# Altium footprint library My Library.PcbLib: 872 footprints (part 45 of 55)
Each footprint in its own frame and in the unit in brackets; x right, y up, seen from the top. Pads: shape width x height; smd on the part's side, far side on the other; paste and mask are expansions set on the pad; w line width, h text height; cw(c..) or ccw(c..) is an arc to the next point about the centre after c.
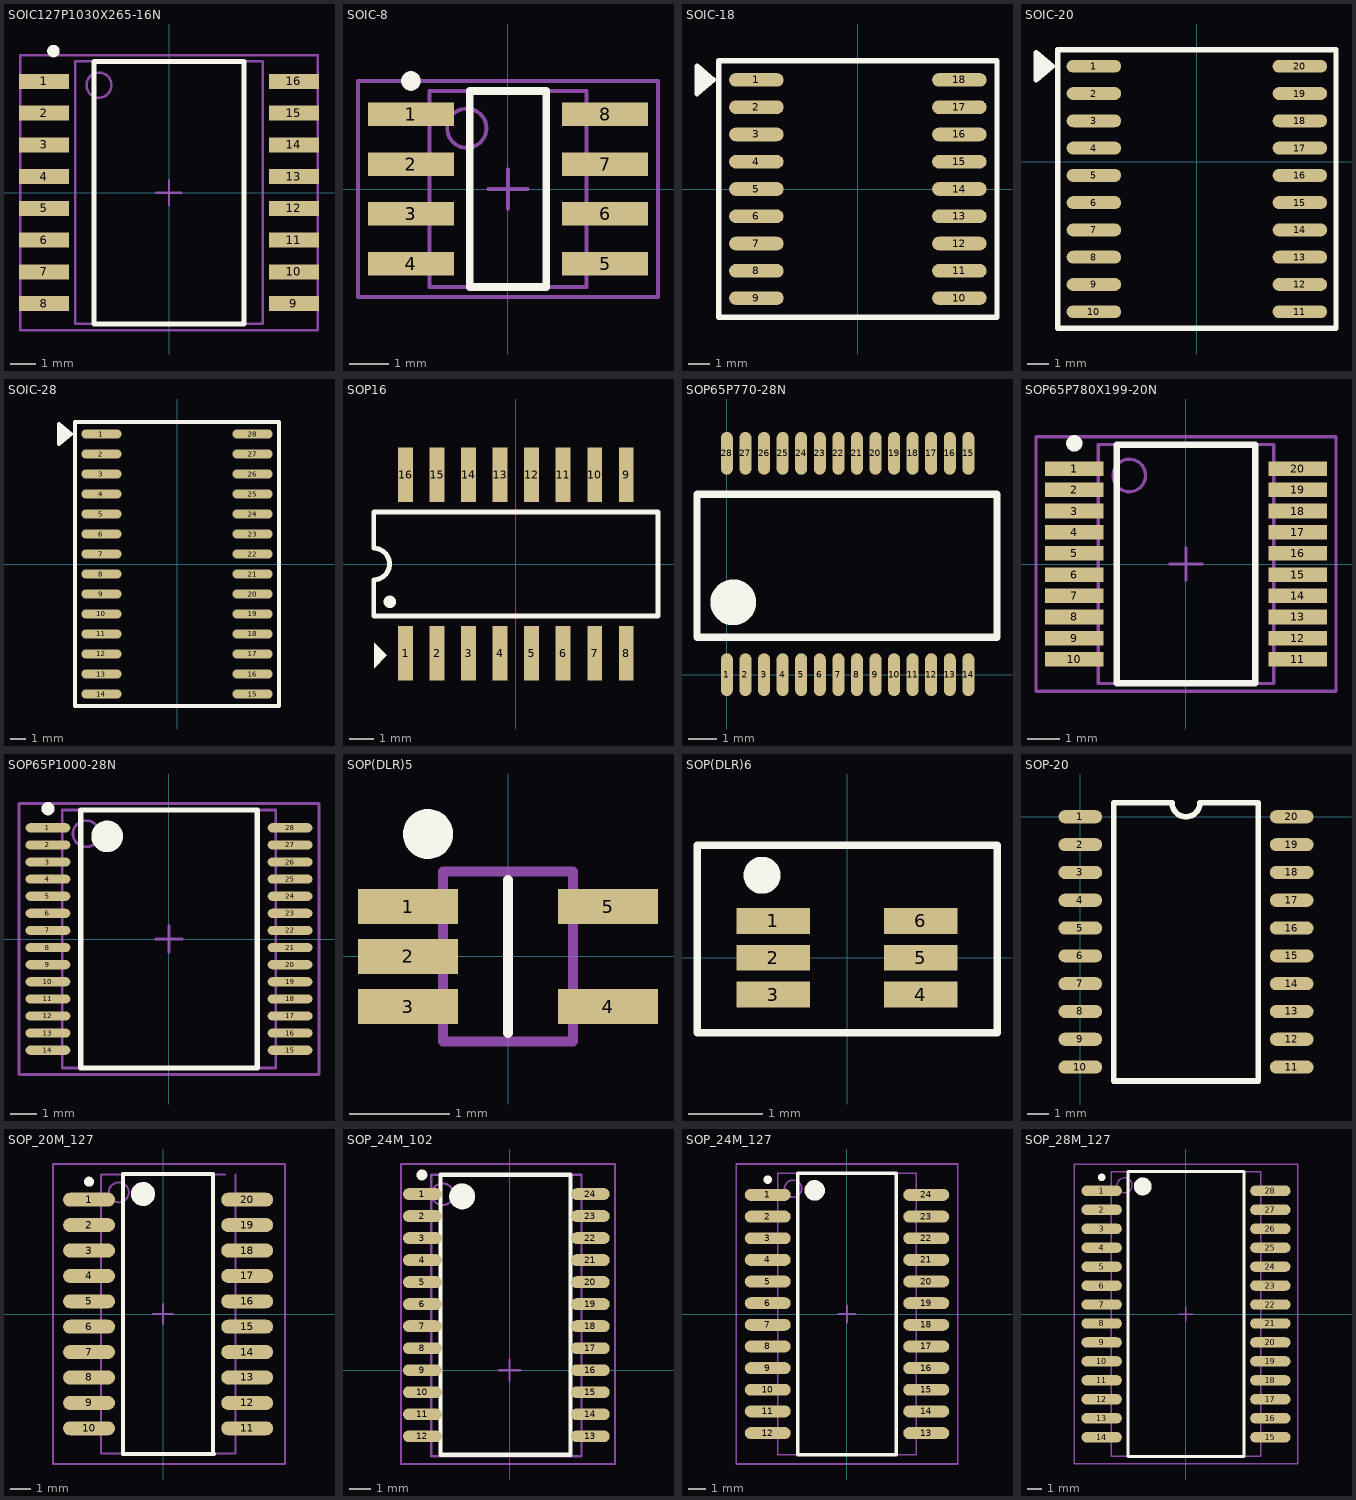
[diagram p44: the footprints below, top view; thin cyan lines are the x and y axes]

## SOIC127P1030X265-16N [mm] "SOIC, 16-Leads, Body 10,5x7,5mm (max), Pitch 1,27mm, IPC Medium Density"
height 2.65
pads (16):
  rect 2x0.6 smd: 1(-5,4.445) 2(-5,3.175) 3(-5,1.905) 4(-5,0.635) 5(-5,-0.635) 6(-5,-1.905) 7(-5,-3.175) 8(-5,-4.445) 9(5,-4.445) 10(5,-3.175) 11(5,-1.905) 12(5,-0.635) 13(5,0.635) 14(5,1.905) 15(5,3.175) 16(5,4.445)
Top Overlay:
  circle w0.25: c-4.621,5.664 r0.125
  lines w0.2: -3,-5.25 3,-5.25 3,5.25 -3,5.25 -3,-5.25
Mechanical 13:
  circle w0.1: c-2.8,4.3 r0.5
  lines w0.1: -3.75,-5.25 3.75,-5.25 3.75,5.25 -3.75,5.25 -3.75,-5.25
Mechanical 15:
  lines w0.1: -0.5,0 0.5,0 ; 0,-0.5 0,0.5 ; -5.95,-5.5 5.95,-5.5 5.95,5.5 -5.95,5.5 -5.95,-5.5
3D body: height 2.65, standoff 0.1, extent -3.75,-5.25 3.75,5.25
3D body: height 1.35, standoff 1.25, extent -4.492,4.191 -3.222,4.699
3D body: height 1.35, standoff 0, extent -4.619,4.191 -4.492,4.699
3D body: height 0.1, standoff 0, extent -5.381,4.191 -4.619,4.699
3D body: height 1.35, standoff 1.25, extent -4.492,2.921 -3.222,3.429
3D body: height 1.35, standoff 0, extent -4.619,2.921 -4.492,3.429
3D body: height 0.1, standoff 0, extent -5.381,2.921 -4.619,3.429
3D body: height 1.35, standoff 1.25, extent -4.492,1.651 -3.222,2.159
3D body: height 1.35, standoff 0, extent -4.619,1.651 -4.492,2.159
3D body: height 0.1, standoff 0, extent -5.381,1.651 -4.619,2.159
3D body: height 1.35, standoff 1.25, extent -4.492,0.381 -3.222,0.889
3D body: height 1.35, standoff 0, extent -4.619,0.381 -4.492,0.889
3D body: height 0.1, standoff 0, extent -5.381,0.381 -4.619,0.889
3D body: height 1.35, standoff 1.25, extent -4.492,-0.889 -3.222,-0.381
3D body: height 1.35, standoff 0, extent -4.619,-0.889 -4.492,-0.381
3D body: height 0.1, standoff 0, extent -5.381,-0.889 -4.619,-0.381
3D body: height 1.35, standoff 1.25, extent -4.492,-2.159 -3.222,-1.651
3D body: height 1.35, standoff 0, extent -4.619,-2.159 -4.492,-1.651
3D body: height 0.1, standoff 0, extent -5.381,-2.159 -4.619,-1.651
3D body: height 1.35, standoff 1.25, extent -4.492,-3.429 -3.222,-2.921
3D body: height 1.35, standoff 0, extent -4.619,-3.429 -4.492,-2.921
3D body: height 0.1, standoff 0, extent -5.381,-3.429 -4.619,-2.921
3D body: height 1.35, standoff 1.25, extent -4.492,-4.699 -3.222,-4.191
3D body: height 1.35, standoff 0, extent -4.619,-4.699 -4.492,-4.191
3D body: height 0.1, standoff 0, extent -5.381,-4.699 -4.619,-4.191
3D body: height 1.35, standoff 1.25, extent 3.222,4.191 4.492,4.699
3D body: height 1.35, standoff 0, extent 4.492,4.191 4.619,4.699
3D body: height 0.1, standoff 0, extent 4.619,4.191 5.381,4.699
3D body: height 1.35, standoff 1.25, extent 3.222,2.921 4.492,3.429
3D body: height 1.35, standoff 0, extent 4.492,2.921 4.619,3.429
3D body: height 0.1, standoff 0, extent 4.619,2.921 5.381,3.429
3D body: height 1.35, standoff 1.25, extent 3.222,1.651 4.492,2.159
3D body: height 1.35, standoff 0, extent 4.492,1.651 4.619,2.159
3D body: height 0.1, standoff 0, extent 4.619,1.651 5.381,2.159
3D body: height 1.35, standoff 1.25, extent 3.222,0.381 4.492,0.889
3D body: height 1.35, standoff 0, extent 4.492,0.381 4.619,0.889
3D body: height 0.1, standoff 0, extent 4.619,0.381 5.381,0.889
3D body: height 1.35, standoff 1.25, extent 3.222,-0.889 4.492,-0.381
3D body: height 1.35, standoff 0, extent 4.492,-0.889 4.619,-0.381
3D body: height 0.1, standoff 0, extent 4.619,-0.889 5.381,-0.381
3D body: height 1.35, standoff 1.25, extent 3.222,-2.159 4.492,-1.651
3D body: height 1.35, standoff 0, extent 4.492,-2.159 4.619,-1.651
3D body: height 0.1, standoff 0, extent 4.619,-2.159 5.381,-1.651
3D body: height 1.35, standoff 1.25, extent 3.222,-3.429 4.492,-2.921
3D body: height 1.35, standoff 0, extent 4.492,-3.429 4.619,-2.921
3D body: height 0.1, standoff 0, extent 4.619,-3.429 5.381,-2.921
3D body: height 0.1, standoff 0, extent 4.619,-4.699 5.381,-4.191
3D body: height 1.35, standoff 0, extent 4.492,-4.699 4.619,-4.191
3D body: height 1.35, standoff 1.25, extent 3.222,-4.699 4.492,-4.191

## SOIC-8 [mm] "SOIC, 8-Leads, Body 5,0x4,0mm (max), Pitch 1,27mm, IPC Medium Density"
height 1.75
pads (8):
  rect 2.2x0.6 smd: 1(-2.475,1.905) 2(-2.475,0.635) 3(-2.475,-0.635) 4(-2.475,-1.905) 5(2.475,-1.905) 6(2.475,-0.635) 7(2.475,0.635) 8(2.475,1.905)
Top Overlay:
  circle w0.25: c-2.475,2.755 r0.125
  lines w0.2: -0.975,-2.5 -0.975,2.5 0.975,2.5 0.975,-2.5 -0.975,-2.5
Mechanical 13:
  circle w0.1: c-1.05,1.55 r0.5
  lines w0.1: -2,-2.5 -2,2.5 2,2.5 2,-2.5 -2,-2.5
Mechanical 15:
  lines w0.1: -0.5,0 0.5,0 ; 0,-0.5 0,0.5 ; -3.825,-2.75 -3.825,2.75 3.825,2.75 3.825,-2.75 -3.825,-2.75
3D body: height 1.75, standoff 0.25, extent -2,-2.5 2,2.5
3D body: height 0.25, standoff 0, extent 2.515,-2.159 3.2,-1.651
3D body: height 0.9, standoff 0.65, extent 2,-2.159 2.515,-1.651
3D body: height 0.9, standoff 0, extent 2.413,-2.159 2.565,-1.651
3D body: height 0.9, standoff 0, extent 2.413,-0.889 2.565,-0.381
3D body: height 0.9, standoff 0.65, extent 2,-0.889 2.515,-0.381
3D body: height 0.25, standoff 0, extent 2.515,-0.889 3.2,-0.381
3D body: height 0.25, standoff 0, extent 2.515,1.651 3.2,2.159
3D body: height 0.9, standoff 0.65, extent 2,1.651 2.515,2.159
3D body: height 0.9, standoff 0, extent 2.413,1.651 2.565,2.159
3D body: height 0.9, standoff 0, extent 2.413,0.381 2.565,0.889
3D body: height 0.9, standoff 0.65, extent 2,0.381 2.515,0.889
3D body: height 0.25, standoff 0, extent 2.515,0.381 3.2,0.889
3D body: height 0.25, standoff 0, extent -3.2,-0.889 -2.515,-0.381
3D body: height 0.9, standoff 0.65, extent -2.515,-0.889 -2,-0.381
3D body: height 0.9, standoff 0, extent -2.565,-0.889 -2.413,-0.381
3D body: height 0.9, standoff 0, extent -2.565,-2.159 -2.413,-1.651
3D body: height 0.9, standoff 0.65, extent -2.515,-2.159 -2,-1.651
3D body: height 0.25, standoff 0, extent -3.2,-2.159 -2.515,-1.651
3D body: height 0.25, standoff 0, extent -3.2,0.381 -2.515,0.889
3D body: height 0.9, standoff 0.65, extent -2.515,0.381 -2,0.889
3D body: height 0.9, standoff 0, extent -2.565,0.381 -2.413,0.889
3D body: height 0.9, standoff 0, extent -2.565,1.651 -2.413,2.159
3D body: height 0.9, standoff 0.65, extent -2.515,1.651 -2,2.159
3D body: height 0.25, standoff 0, extent -3.2,1.651 -2.515,2.159

## SOIC-18 [mm]
pads (18):
  oval 2.54x0.635 smd: 1(-4.725,5.08) 2(-4.725,3.81) 3(-4.725,2.54) 4(-4.725,1.27) 5(-4.725,0) 6(-4.725,-1.27) 7(-4.725,-2.54) 8(-4.725,-3.81) 9(-4.725,-5.08) 10(4.725,-5.08) 11(4.725,-3.81) 12(4.725,-2.54) 13(4.725,-1.27) 14(4.725,0) 15(4.725,1.27) 16(4.725,2.54) 17(4.725,3.81) 18(4.725,5.08)
Top Overlay:
  region: -6.731,5.08 -7.493,5.715 -7.493,4.445
  lines w0.254: -7.493,4.445 -6.731,5.08 -7.493,5.715 -7.493,4.445 ; -6.477,-5.969 6.477,-5.969 6.477,5.969 -6.477,5.969 -6.477,-5.969
3D body: height 2.66, standoff 0, extent -3.359,4.541 -2.341,5.559
3D body: height 2.65, standoff 0.25, extent -3.8,-6 3.8,6
3D body: height 1.35, standoff 1.25, extent 3.531,4.826 4.013,5.334
3D body: height 1.35, standoff 0, extent 4.013,4.826 4.14,5.334
3D body: height 0.1, standoff 0, extent 4.14,4.826 5.029,5.334
3D body: height 1.35, standoff 1.25, extent 3.531,2.286 4.013,2.794
3D body: height 1.35, standoff 0, extent 4.013,2.286 4.14,2.794
3D body: height 0.1, standoff 0, extent 4.14,2.286 5.029,2.794
3D body: height 0.1, standoff 0, extent 4.14,3.556 5.029,4.064
3D body: height 1.35, standoff 0, extent 4.013,3.556 4.14,4.064
3D body: height 1.35, standoff 1.25, extent 3.531,3.556 4.013,4.064
3D body: height 1.35, standoff 1.25, extent 3.531,-0.254 4.013,0.254
3D body: height 1.35, standoff 0, extent 4.013,-0.254 4.14,0.254
3D body: height 0.1, standoff 0, extent 4.14,-0.254 5.029,0.254
3D body: height 0.1, standoff 0, extent 4.14,1.016 5.029,1.524
3D body: height 1.35, standoff 0, extent 4.013,1.016 4.14,1.524
3D body: height 1.35, standoff 1.25, extent 3.531,1.016 4.013,1.524
3D body: height 1.35, standoff 1.25, extent 3.531,-2.794 4.013,-2.286
3D body: height 1.35, standoff 0, extent 4.013,-2.794 4.14,-2.286
3D body: height 0.1, standoff 0, extent 4.14,-2.794 5.029,-2.286
3D body: height 0.1, standoff 0, extent 4.14,-1.524 5.029,-1.016
3D body: height 1.35, standoff 0, extent 4.013,-1.524 4.14,-1.016
3D body: height 1.35, standoff 1.25, extent 3.531,-1.524 4.013,-1.016
3D body: height 1.35, standoff 1.25, extent 3.531,-4.064 4.013,-3.556
3D body: height 1.35, standoff 0, extent 4.013,-4.064 4.14,-3.556
3D body: height 0.1, standoff 0, extent 4.14,-4.064 5.029,-3.556
3D body: height 0.1, standoff 0, extent 4.14,-5.334 5.029,-4.826
3D body: height 1.35, standoff 0, extent 4.013,-5.334 4.14,-4.826
3D body: height 1.35, standoff 1.25, extent 3.531,-5.334 4.013,-4.826
3D body: height 1.35, standoff 1.25, extent -4.013,-5.334 -3.531,-4.826
3D body: height 1.35, standoff 0, extent -4.14,-5.334 -4.013,-4.826
3D body: height 0.1, standoff 0, extent -5.029,-5.334 -4.14,-4.826
3D body: height 1.35, standoff 1.25, extent -4.013,-2.794 -3.531,-2.286
3D body: height 1.35, standoff 0, extent -4.14,-2.794 -4.013,-2.286
3D body: height 0.1, standoff 0, extent -5.029,-2.794 -4.14,-2.286
3D body: height 0.1, standoff 0, extent -5.029,-4.064 -4.14,-3.556
3D body: height 1.35, standoff 0, extent -4.14,-4.064 -4.013,-3.556
3D body: height 1.35, standoff 1.25, extent -4.013,-4.064 -3.531,-3.556
3D body: height 1.35, standoff 1.25, extent -4.013,-0.254 -3.531,0.254
3D body: height 1.35, standoff 0, extent -4.14,-0.254 -4.013,0.254
3D body: height 0.1, standoff 0, extent -5.029,-0.254 -4.14,0.254
3D body: height 0.1, standoff 0, extent -5.029,-1.524 -4.14,-1.016
3D body: height 1.35, standoff 0, extent -4.14,-1.524 -4.013,-1.016
3D body: height 1.35, standoff 1.25, extent -4.013,-1.524 -3.531,-1.016
3D body: height 1.35, standoff 1.25, extent -4.013,2.286 -3.531,2.794
3D body: height 1.35, standoff 0, extent -4.14,2.286 -4.013,2.794
3D body: height 0.1, standoff 0, extent -5.029,2.286 -4.14,2.794
3D body: height 0.1, standoff 0, extent -5.029,1.016 -4.14,1.524
3D body: height 1.35, standoff 0, extent -4.14,1.016 -4.013,1.524
3D body: height 1.35, standoff 1.25, extent -4.013,1.016 -3.531,1.524
3D body: height 1.35, standoff 1.25, extent -4.013,3.556 -3.531,4.064
3D body: height 1.35, standoff 0, extent -4.14,3.556 -4.013,4.064
3D body: height 0.1, standoff 0, extent -5.029,3.556 -4.14,4.064
3D body: height 0.1, standoff 0, extent -5.029,4.826 -4.14,5.334
3D body: height 1.35, standoff 0, extent -4.14,4.826 -4.013,5.334
3D body: height 1.35, standoff 1.25, extent -4.013,4.826 -3.531,5.334

## SOIC-20 [mm]
pads (20):
  oval 2.54x0.6 smd: 1(-4.795,4.445) 2(-4.795,3.175) 3(-4.795,1.905) 4(-4.795,0.635) 5(-4.795,-0.635) 6(-4.795,-1.905) 7(-4.795,-3.175) 8(-4.795,-4.445) 9(-4.795,-5.715) 10(-4.795,-6.985) 11(4.795,-6.985) 12(4.795,-5.715) 13(4.795,-4.445) 14(4.795,-3.175) 15(4.795,-1.905) 16(4.795,-0.635) 17(4.795,0.635) 18(4.795,1.905) 19(4.795,3.175) 20(4.795,4.445)
Top Overlay:
  region: -6.731,4.445 -7.493,5.08 -7.493,3.81
  lines w0.254: -7.493,3.81 -7.493,5.08 -6.731,4.445 -7.493,3.81 ; -6.477,-7.747 6.477,-7.747 6.477,5.207 -6.477,5.207 -6.477,-7.747
Mechanical 13:
  lines w0.1: -3.75,-7.69 3.75,-7.69
3D body: height 0.1, standoff 0, extent -5.334,-5.969 -4.572,-5.461
3D body: height 1.35, standoff 0, extent -4.572,-5.969 -4.445,-5.461
3D body: height 1.35, standoff 1.25, extent -4.445,-5.969 -3.175,-5.461
3D body: height 0.1, standoff 0, extent -5.334,-7.239 -4.572,-6.731
3D body: height 1.35, standoff 0, extent -4.572,-7.239 -4.445,-6.731
3D body: height 1.35, standoff 1.25, extent -4.445,-7.239 -3.175,-6.731
3D body: height 1.35, standoff 1.25, extent 3.175,-5.969 4.445,-5.461
3D body: height 1.35, standoff 0, extent 4.445,-5.969 4.572,-5.461
3D body: height 0.1, standoff 0, extent 4.572,-5.969 5.334,-5.461
3D body: height 0.1, standoff 0, extent 4.572,-7.239 5.334,-6.731
3D body: height 1.35, standoff 0, extent 4.445,-7.239 4.572,-6.731
3D body: height 1.35, standoff 1.25, extent 3.175,-7.239 4.445,-6.731
3D body: height 1.35, standoff 1.25, extent 3.175,-4.699 4.445,-4.191
3D body: height 1.35, standoff 0, extent 4.445,-4.699 4.572,-4.191
3D body: height 0.1, standoff 0, extent 4.572,-4.699 5.334,-4.191
3D body: height 0.1, standoff 0, extent 4.572,-3.429 5.334,-2.921
3D body: height 1.35, standoff 0, extent 4.445,-3.429 4.572,-2.921
3D body: height 1.35, standoff 1.25, extent 3.175,-3.429 4.445,-2.921
3D body: height 0.1, standoff 0, extent 4.572,-2.159 5.334,-1.651
3D body: height 1.35, standoff 0, extent 4.445,-2.159 4.572,-1.651
3D body: height 1.35, standoff 1.25, extent 3.175,-2.159 4.445,-1.651
3D body: height 0.1, standoff 0, extent 4.572,-0.889 5.334,-0.381
3D body: height 1.35, standoff 0, extent 4.445,-0.889 4.572,-0.381
3D body: height 1.35, standoff 1.25, extent 3.175,-0.889 4.445,-0.381
3D body: height 0.1, standoff 0, extent 4.572,0.381 5.334,0.889
3D body: height 1.35, standoff 0, extent 4.445,0.381 4.572,0.889
3D body: height 1.35, standoff 1.25, extent 3.175,0.381 4.445,0.889
3D body: height 0.1, standoff 0, extent 4.572,1.651 5.334,2.159
3D body: height 1.35, standoff 0, extent 4.445,1.651 4.572,2.159
3D body: height 1.35, standoff 1.25, extent 3.175,1.651 4.445,2.159
3D body: height 0.1, standoff 0, extent 4.572,2.921 5.334,3.429
3D body: height 1.35, standoff 0, extent 4.445,2.921 4.572,3.429
3D body: height 1.35, standoff 1.25, extent 3.175,2.921 4.445,3.429
3D body: height 0.1, standoff 0, extent 4.572,4.191 5.334,4.699
3D body: height 1.35, standoff 0, extent 4.445,4.191 4.572,4.699
3D body: height 1.35, standoff 1.25, extent 3.175,4.191 4.445,4.699
3D body: height 1.35, standoff 1.25, extent -4.445,-4.699 -3.175,-4.191
3D body: height 1.35, standoff 0, extent -4.572,-4.699 -4.445,-4.191
3D body: height 0.1, standoff 0, extent -5.334,-4.699 -4.572,-4.191
3D body: height 1.35, standoff 1.25, extent -4.445,-3.429 -3.175,-2.921
3D body: height 1.35, standoff 0, extent -4.572,-3.429 -4.445,-2.921
3D body: height 0.1, standoff 0, extent -5.334,-3.429 -4.572,-2.921
3D body: height 1.35, standoff 1.25, extent -4.445,-2.159 -3.175,-1.651
3D body: height 1.35, standoff 0, extent -4.572,-2.159 -4.445,-1.651
3D body: height 0.1, standoff 0, extent -5.334,-2.159 -4.572,-1.651
3D body: height 1.35, standoff 1.25, extent -4.445,-0.889 -3.175,-0.381
3D body: height 1.35, standoff 0, extent -4.572,-0.889 -4.445,-0.381
3D body: height 0.1, standoff 0, extent -5.334,-0.889 -4.572,-0.381
3D body: height 1.35, standoff 1.25, extent -4.445,0.381 -3.175,0.889
3D body: height 1.35, standoff 0, extent -4.572,0.381 -4.445,0.889
3D body: height 0.1, standoff 0, extent -5.334,0.381 -4.572,0.889
3D body: height 1.35, standoff 1.25, extent -4.445,1.651 -3.175,2.159
3D body: height 1.35, standoff 0, extent -4.572,1.651 -4.445,2.159
3D body: height 0.1, standoff 0, extent -5.334,1.651 -4.572,2.159
3D body: height 1.35, standoff 1.25, extent -4.445,2.921 -3.175,3.429
3D body: height 1.35, standoff 0, extent -4.572,2.921 -4.445,3.429
3D body: height 0.1, standoff 0, extent -5.334,2.921 -4.572,3.429
3D body: height 0.1, standoff 0, extent -5.334,4.191 -4.572,4.699
3D body: height 1.35, standoff 0, extent -4.572,4.191 -4.445,4.699
3D body: height 1.35, standoff 1.25, extent -4.445,4.191 -3.175,4.699
3D body: height 2.65, standoff 0, extent -3.474,3.571 -2.456,4.589
3D body: height 2.65, standoff 0.1, extent -3.75,-7.747 3.75,5.15

## SOIC-28 [mm] "SOIC, 16-Leads, Body 10.3x7.5mm (max), Pitch 1.27mm, IPC Medium Density"
height 2.65
pads (28):
  oval 2.54x0.6 smd: 1(-4.795,8.255) 2(-4.795,6.985) 3(-4.795,5.715) 4(-4.795,4.445) 5(-4.795,3.175) 6(-4.795,1.905) 7(-4.795,0.635) 8(-4.795,-0.635) 9(-4.795,-1.905) 10(-4.795,-3.175) 11(-4.795,-4.445) 12(-4.795,-5.715) 13(-4.795,-6.985) 14(-4.795,-8.255) 15(4.795,-8.255) 16(4.795,-6.985) 17(4.795,-5.715) 18(4.795,-4.445) 19(4.795,-3.175) 20(4.795,-1.905) 21(4.795,-0.635) 22(4.795,0.635) 23(4.795,1.905) 24(4.795,3.175) 25(4.795,4.445) 26(4.795,5.715) 27(4.795,6.985) 28(4.795,8.255)
Top Overlay:
  region: -6.731,8.255 -7.493,8.89 -7.493,7.62
  lines w0.254: -7.493,7.62 -6.731,8.255 -7.493,8.89 -7.493,7.62 ; -6.477,-9.017 6.477,-9.017 6.477,9.017 -6.477,9.017 -6.477,-9.017
3D body: height 2.65, standoff 0.1, extent -3.75,-9.017 3.75,8.96
3D body: height 0.1, standoff 0, extent -5.334,-7.239 -4.572,-6.731
3D body: height 1.35, standoff 0, extent -4.572,-7.239 -4.445,-6.731
3D body: height 1.35, standoff 1.25, extent -4.445,-7.239 -3.175,-6.731
3D body: height 0.1, standoff 0, extent -5.334,-8.509 -4.572,-8.001
3D body: height 1.35, standoff 0, extent -4.572,-8.509 -4.445,-8.001
3D body: height 1.35, standoff 1.25, extent -4.445,-8.509 -3.175,-8.001
3D body: height 1.35, standoff 1.25, extent 3.175,-7.239 4.445,-6.731
3D body: height 1.35, standoff 0, extent 4.445,-7.239 4.572,-6.731
3D body: height 0.1, standoff 0, extent 4.572,-7.239 5.334,-6.731
3D body: height 0.1, standoff 0, extent 4.572,-8.509 5.334,-8.001
3D body: height 1.35, standoff 0, extent 4.445,-8.509 4.572,-8.001
3D body: height 1.35, standoff 1.25, extent 3.175,-8.509 4.445,-8.001
3D body: height 1.35, standoff 1.25, extent 3.175,-5.969 4.445,-5.461
3D body: height 1.35, standoff 0, extent 4.445,-5.969 4.572,-5.461
3D body: height 0.1, standoff 0, extent 4.572,-5.969 5.334,-5.461
3D body: height 0.1, standoff 0, extent 4.572,-4.699 5.334,-4.191
3D body: height 1.35, standoff 0, extent 4.445,-4.699 4.572,-4.191
3D body: height 1.35, standoff 1.25, extent 3.175,-4.699 4.445,-4.191
3D body: height 1.35, standoff 1.25, extent -4.445,-5.969 -3.175,-5.461
3D body: height 1.35, standoff 0, extent -4.572,-5.969 -4.445,-5.461
3D body: height 0.1, standoff 0, extent -5.334,-5.969 -4.572,-5.461
3D body: height 1.35, standoff 1.25, extent -4.445,-4.699 -3.175,-4.191
3D body: height 1.35, standoff 0, extent -4.572,-4.699 -4.445,-4.191
3D body: height 0.1, standoff 0, extent -5.334,-4.699 -4.572,-4.191
3D body: height 2.65, standoff 0, extent -3.464,7.391 -2.466,8.389
3D body: height 1.35, standoff 1.25, extent -4.445,8.001 -3.175,8.509
3D body: height 1.35, standoff 0, extent -4.572,8.001 -4.445,8.509
3D body: height 0.1, standoff 0, extent -5.334,8.001 -4.572,8.509
3D body: height 0.1, standoff 0, extent -5.334,6.731 -4.572,7.239
3D body: height 1.35, standoff 0, extent -4.572,6.731 -4.445,7.239
3D body: height 1.35, standoff 1.25, extent -4.445,6.731 -3.175,7.239
3D body: height 0.1, standoff 0, extent -5.334,5.461 -4.572,5.969
3D body: height 1.35, standoff 0, extent -4.572,5.461 -4.445,5.969
3D body: height 1.35, standoff 1.25, extent -4.445,5.461 -3.175,5.969
3D body: height 0.1, standoff 0, extent -5.334,4.191 -4.572,4.699
3D body: height 1.35, standoff 0, extent -4.572,4.191 -4.445,4.699
3D body: height 1.35, standoff 1.25, extent -4.445,4.191 -3.175,4.699
3D body: height 0.1, standoff 0, extent -5.334,2.921 -4.572,3.429
3D body: height 1.35, standoff 0, extent -4.572,2.921 -4.445,3.429
3D body: height 1.35, standoff 1.25, extent -4.445,2.921 -3.175,3.429
3D body: height 0.1, standoff 0, extent -5.334,1.651 -4.572,2.159
3D body: height 1.35, standoff 0, extent -4.572,1.651 -4.445,2.159
3D body: height 1.35, standoff 1.25, extent -4.445,1.651 -3.175,2.159
3D body: height 0.1, standoff 0, extent -5.334,0.381 -4.572,0.889
3D body: height 1.35, standoff 0, extent -4.572,0.381 -4.445,0.889
3D body: height 1.35, standoff 1.25, extent -4.445,0.381 -3.175,0.889
3D body: height 0.1, standoff 0, extent -5.334,-0.889 -4.572,-0.381
3D body: height 1.35, standoff 0, extent -4.572,-0.889 -4.445,-0.381
3D body: height 1.35, standoff 1.25, extent -4.445,-0.889 -3.175,-0.381
3D body: height 1.35, standoff 1.25, extent 3.175,8.001 4.445,8.509
3D body: height 1.35, standoff 0, extent 4.445,8.001 4.572,8.509
3D body: height 0.1, standoff 0, extent 4.572,8.001 5.334,8.509
3D body: height 1.35, standoff 1.25, extent 3.175,6.731 4.445,7.239
3D body: height 1.35, standoff 0, extent 4.445,6.731 4.572,7.239
3D body: height 0.1, standoff 0, extent 4.572,6.731 5.334,7.239
3D body: height 1.35, standoff 1.25, extent 3.175,5.461 4.445,5.969
3D body: height 1.35, standoff 0, extent 4.445,5.461 4.572,5.969
3D body: height 0.1, standoff 0, extent 4.572,5.461 5.334,5.969
3D body: height 1.35, standoff 1.25, extent 3.175,4.191 4.445,4.699
3D body: height 1.35, standoff 0, extent 4.445,4.191 4.572,4.699
3D body: height 0.1, standoff 0, extent 4.572,4.191 5.334,4.699
3D body: height 1.35, standoff 1.25, extent 3.175,2.921 4.445,3.429
3D body: height 1.35, standoff 0, extent 4.445,2.921 4.572,3.429
3D body: height 0.1, standoff 0, extent 4.572,2.921 5.334,3.429
3D body: height 1.35, standoff 1.25, extent 3.175,1.651 4.445,2.159
3D body: height 1.35, standoff 0, extent 4.445,1.651 4.572,2.159
3D body: height 0.1, standoff 0, extent 4.572,1.651 5.334,2.159
3D body: height 1.35, standoff 1.25, extent 3.175,0.381 4.445,0.889
3D body: height 1.35, standoff 0, extent 4.445,0.381 4.572,0.889
3D body: height 0.1, standoff 0, extent 4.572,0.381 5.334,0.889
3D body: height 0.1, standoff 0, extent 4.572,-0.889 5.334,-0.381
3D body: height 1.35, standoff 0, extent 4.445,-0.889 4.572,-0.381
3D body: height 1.35, standoff 1.25, extent 3.175,-0.889 4.445,-0.381
3D body: height 1.35, standoff 1.25, extent 3.175,-3.429 4.445,-2.921
3D body: height 1.35, standoff 0, extent 4.445,-3.429 4.572,-2.921
3D body: height 0.1, standoff 0, extent 4.572,-3.429 5.334,-2.921
3D body: height 0.1, standoff 0, extent 4.572,-2.159 5.334,-1.651
3D body: height 1.35, standoff 0, extent 4.445,-2.159 4.572,-1.651
3D body: height 1.35, standoff 1.25, extent 3.175,-2.159 4.445,-1.651
3D body: height 1.35, standoff 1.25, extent -4.445,-3.429 -3.175,-2.921
3D body: height 1.35, standoff 0, extent -4.572,-3.429 -4.445,-2.921
3D body: height 0.1, standoff 0, extent -5.334,-3.429 -4.572,-2.921
3D body: height 1.35, standoff 1.25, extent -4.445,-2.159 -3.175,-1.651
3D body: height 1.35, standoff 0, extent -4.572,-2.159 -4.445,-1.651
3D body: height 0.1, standoff 0, extent -5.334,-2.159 -4.572,-1.651

## SOP16 [mm] "Small Outline; 16 Leads; Body Width 5.6 mm; Pitch 1.27 mm"
height 2
pads (16):
  rect 0.6x2.2 smd: 1(-4.445,-3.6) 2(-3.175,-3.6) 3(-1.905,-3.6) 4(-0.635,-3.6) 5(0.635,-3.6) 6(1.905,-3.6) 7(3.175,-3.6) 8(4.445,-3.6) 9(4.445,3.6) 10(3.175,3.6) 11(1.905,3.6) 12(0.635,3.6) 13(-0.635,3.6) 14(-1.905,3.6) 15(-3.175,3.6) 16(-4.445,3.6)
Top Overlay:
  circle w0.25: c-5.078,-1.524 r0.125
  region: -5.715,-4.191 -5.207,-3.683 -5.715,-3.175
  lines w0.2: -5.725,-2.1 5.725,-2.1 5.725,2.1 -5.725,2.1 -5.725,0.635 cw(c-5.725,0) -5.725,-0.635 -5.725,-2.1

## SOP65P770-28N [mil]
pads (28):
  oval 16.53x59.03 smd mask+7.9: 1(0,0) 2(25.6,0) 3(51.18,0) 4(76.78,0) 5(102.37,0) 6(127.97,0) 7(153.57,0) 8(179.15,0) 9(204.75,0) 10(230.35,0) 11(255.93,0) 12(281.53,0) 13(307.12,0) 14(332.7,0) 15(332.7,305) 16(307.12,305) 17(281.53,305) 18(255.93,305) 19(230.35,305) 20(204.75,305) 21(179.15,305) 22(153.57,305) 23(127.97,305) 24(102.37,305) 25(76.78,305) 26(51.18,305) 27(25.6,305) 28(0,305)
Top Overlay:
  circle w39.37: c8.8,99.7 r11.88
  lines w10: -41.22,51.66 372.21,51.66 372.21,248.53 -41.22,248.53 -41.22,51.66
3D body "SOP65P770x200-28N.step": height 84.65, standoff 0, extent -37.01,0.01 369.69,305.35

## SOP65P780X199-20N [mm] "SOP, 20-Leads, Body 7.3x5.4mm (max), Pitch 0.65mm, IPC Medium Density"
height 1.99
pads (20):
  rect 1.8x0.45 smd: 1(-3.425,2.925) 2(-3.425,2.275) 3(-3.425,1.625) 4(-3.425,0.975) 5(-3.425,0.325) 6(-3.425,-0.325) 7(-3.425,-0.975) 8(-3.425,-1.625) 9(-3.425,-2.275) 10(-3.425,-2.925) 11(3.425,-2.925) 12(3.425,-2.275) 13(3.425,-1.625) 14(3.425,-0.975) 15(3.425,-0.325) 16(3.425,0.325) 17(3.425,0.975) 18(3.425,1.625) 19(3.425,2.275) 20(3.425,2.925)
Top Overlay:
  circle w0.25: c-3.425,3.7 r0.125
  lines w0.2: -2.125,-3.65 2.125,-3.65 2.125,3.65 -2.125,3.65 -2.125,-3.65
Mechanical 13:
  circle w0.1: c-1.74,2.715 r0.5
  lines w0.1: -2.69,-3.665 2.69,-3.665 2.69,3.665 -2.69,3.665 -2.69,-3.665
Mechanical 15:
  lines w0.1: -0.5,0 0.5,0 ; 0,-0.5 0,0.5 ; -4.6,-3.9 4.6,-3.9 4.6,3.9 -4.6,3.9 -4.6,-3.9
3D body: height 1.99, standoff 0.21, extent -2.69,-3.665 2.69,3.665

## SOP65P1000-28N [mm] "SOP, 28-Leads, Body 9.7x8mm, Pitch 0.65mm, IPC Medium Density"
height 2
pads (28):
  oval 1.7x0.35 smd: 1(-4.6,4.225) 2(-4.6,3.575) 3(-4.6,2.925) 4(-4.6,2.275) 5(-4.6,1.625) 6(-4.6,0.975) 7(-4.6,0.325) 8(-4.6,-0.325) 9(-4.6,-0.975) 10(-4.6,-1.625) 11(-4.6,-2.275) 12(-4.6,-2.925) 13(-4.6,-3.575) 14(-4.6,-4.225) 15(4.6,-4.225) 16(4.6,-3.575) 17(4.6,-2.925) 18(4.6,-2.275) 19(4.6,-1.625) 20(4.6,-0.975) 21(4.6,-0.325) 22(4.6,0.325) 23(4.6,0.975) 24(4.6,1.625) 25(4.6,2.275) 26(4.6,2.925) 27(4.6,3.575) 28(4.6,4.225)
Top Overlay:
  circle w0.6: c-2.35,3.9 r0.3
  circle w0.25: c-4.6,4.95 r0.125
  lines w0.2: -3.35,-4.9 3.35,-4.9 3.35,4.9 -3.35,4.9 -3.35,-4.9
Mechanical 13:
  circle w0.1: c-3.15,4 r0.5
  lines w0.1: -4.05,-4.9 4.05,-4.9 4.05,4.9 -4.05,4.9 -4.05,-4.9
Mechanical 15:
  lines w0.1: -0.5,0 0.5,0 ; 0,-0.5 0,0.5 ; -5.7,-5.15 5.7,-5.15 5.7,5.15 -5.7,5.15 -5.7,-5.15
3D body: height 2, standoff 0, extent -4.05,-4.9 4.05,4.9

## SOP(DLR)5 [mm] "SOT23, 5-Leads, Body 1.7x1.7mm (max), Pitch 0.50mm, IPC Medium Density"
height 0.6
pads (5):
  rect 1x0.35 smd: 1(-1,0.5) 2(-1,0) 3(-1,-0.5) 4(1,-0.5) 5(1,0.5)
Top Overlay:
  circle w0.25: c-0.8,1.225 r0.125
  lines w0.102: 0,-0.762 0,0.762
Mechanical 13:
  lines w0.1: -0.65,-0.85 -0.65,0.85 0.65,0.85 0.65,-0.85 -0.65,-0.85
3D body: height 0.35, standoff 0.25, extent -0.761,0.386 -0.501,0.614
3D body: height 0.35, standoff 0, extent -0.847,0.386 -0.761,0.614
3D body: height 0.1, standoff 0, extent -1.076,0.386 -0.847,0.614
3D body: height 0.1, standoff 0, extent -1.076,-0.114 -0.847,0.114
3D body: height 0.35, standoff 0, extent -0.847,-0.114 -0.761,0.114
3D body: height 0.35, standoff 0.25, extent -0.761,-0.114 -0.501,0.114
3D body: height 0.1, standoff 0, extent -1.076,-0.614 -0.847,-0.386
3D body: height 0.35, standoff 0, extent -0.847,-0.614 -0.761,-0.386
3D body: height 0.35, standoff 0.25, extent -0.761,-0.614 -0.501,-0.386
3D body: height 0.1, standoff 0, extent 0.847,-0.614 1.076,-0.386
3D body: height 0.35, standoff 0, extent 0.761,-0.614 0.847,-0.386
3D body: height 0.35, standoff 0.25, extent 0.501,-0.614 0.761,-0.386
3D body: height 0.1, standoff 0, extent 0.847,0.386 1.076,0.614
3D body: height 0.35, standoff 0, extent 0.761,0.386 0.847,0.614
3D body: height 0.35, standoff 0.25, extent 0.501,0.386 0.761,0.614
3D body: height 0.6, standoff 0.05, extent -0.65,-0.85 0.65,0.85

## SOP(DLR)6 [mm] "SOT23, 6-Leads, Body 1.7x1.7mm (max), Pitch 0.50mm, IPC Medium Density"
height 0.6
pads (6):
  rect 1x0.35 smd: 1(-1,0.5) 2(-1,0) 3(-1,-0.5) 4(1,-0.5) 5(1,0) 6(1,0.5)
Top Overlay:
  circle w0.25: c-1.15,1.118 r0.125
  lines w0.102: -2.032,-1.016 2.032,-1.016 2.032,1.524 0,1.524 -2.032,1.524 -2.032,-1.016
3D body: height 0.35, standoff 0.25, extent -0.761,0.386 -0.501,0.614
3D body: height 0.35, standoff 0, extent -0.847,0.386 -0.761,0.614
3D body: height 0.1, standoff 0, extent -1.076,0.386 -0.847,0.614
3D body: height 0.1, standoff 0, extent -1.076,-0.114 -0.847,0.114
3D body: height 0.35, standoff 0, extent -0.847,-0.114 -0.761,0.114
3D body: height 0.35, standoff 0.25, extent -0.761,-0.114 -0.501,0.114
3D body: height 0.1, standoff 0, extent -1.076,-0.614 -0.847,-0.386
3D body: height 0.35, standoff 0, extent -0.847,-0.614 -0.761,-0.386
3D body: height 0.35, standoff 0.25, extent -0.761,-0.614 -0.501,-0.386
3D body: height 0.1, standoff 0, extent 0.847,-0.614 1.076,-0.386
3D body: height 0.35, standoff 0, extent 0.761,-0.614 0.847,-0.386
3D body: height 0.35, standoff 0.25, extent 0.501,-0.614 0.761,-0.386
3D body: height 0.1, standoff 0, extent 0.847,0.386 1.076,0.614
3D body: height 0.35, standoff 0, extent 0.761,0.386 0.847,0.614
3D body: height 0.35, standoff 0.25, extent 0.501,0.386 0.761,0.614
3D body: height 0.35, standoff 0.25, extent 0.501,-0.122 0.761,0.106
3D body: height 0.35, standoff 0, extent 0.761,-0.122 0.847,0.106
3D body: height 0.1, standoff 0, extent 0.847,-0.122 1.076,0.106
3D body: height 0.6, standoff 0.05, extent -0.65,-0.85 0.65,0.85

## SOP-20 [mm]
pads (20):
  oval 2x0.6 smd: 1(0,0) 2(0,-1.27) 3(0,-2.54) 4(0,-3.81) 5(0,-5.08) 6(0,-6.35) 7(0,-7.62) 8(0,-8.89) 9(0,-10.16) 10(0,-11.43) 11(9.652,-11.43) 12(9.652,-10.16) 13(9.652,-8.89) 14(9.652,-7.62) 15(9.652,-6.35) 16(9.652,-5.08) 17(9.652,-3.81) 18(9.652,-2.54) 19(9.652,-1.27) 20(9.652,0)
Top Overlay:
  lines w0.254: 1.524,-12.065 8.128,-12.065 8.128,0.635 5.461,0.635 cw(c4.826,0.635) 4.191,0.635 1.524,0.635 1.524,-12.065

## SOP_20M_127 [mm] "SOP, 20-Leads, Body 13.4x6.2mm, Pitch 1.27mm, IPC Low Density"
height 2
pads (20):
  oval 2.6x0.7 smd: 1(-3.7,5.715) 2(-3.7,4.445) 3(-3.7,3.175) 4(-3.7,1.905) 5(-3.7,0.635) 6(-3.7,-0.635) 7(-3.7,-1.905) 8(-3.7,-3.175) 9(-3.7,-4.445) 10(-3.7,-5.715) 11(4.208,-5.715) 12(4.208,-4.445) 13(4.208,-3.175) 14(4.208,-1.905) 15(4.208,-0.635) 16(4.208,0.635) 17(4.208,1.905) 18(4.208,3.175) 19(4.208,4.445) 20(4.208,5.715)
Top Overlay:
  circle w0.6: c-1,6 r0.3
  circle w0.25: c-3.7,6.615 r0.125
  lines w0.2: 2.413,7 -2,7 -2,-7 2.54,-7 ; 2.508,-7 2.508,7
Mechanical 13:
  circle w0.1: c-2.21,6.085 r0.5
  lines w0.1: 3.11,6.985 -3.11,6.985 -3.11,-6.985 3.556,-6.985 ; 3.618,-6.985 3.618,6.985
Mechanical 15:
  lines w0.1: -0.5,0 0.5,0 ; 0,-0.5 0,0.5 ; -5.5,-7.5 6.096,-7.5 6.096,7.5 -5.5,7.5 -5.5,-7.5
3D body: height 2, standoff 0, extent -3.11,-6.985 3.556,6.985

## SOP_24M_102 [mm] "24-Pin Small Outline Package 1.02 mm Pitch"
height 2.64
pads (24):
  oval 1.8x0.55 smd: 1(-4.039,8.16) 2(-4.039,7.14) 3(-4.039,6.12) 4(-4.039,5.1) 5(-4.039,4.08) 6(-4.039,3.06) 7(-4.039,2.04) 8(-4.039,1.02) 9(-4.039,0) 10(-4.039,-1.02) 11(-4.039,-2.04) 12(-4.039,-3.06) 13(3.734,-3.06) 14(3.734,-2.04) 15(3.734,-1.02) 16(3.734,0) 17(3.734,1.02) 18(3.734,2.04) 19(3.734,3.06) 20(3.734,4.08) 21(3.734,5.1) 22(3.734,6.12) 23(3.734,7.14) 24(3.734,8.16)
Top Overlay:
  circle w0.25: c-4.062,9.042 r0.125
  circle w0.6: c-2.2,8.05 r0.3
  lines w0.2: -3.2,-3.912 -3.2,9.05 2.819,9.05 2.819,-3.912 -3.2,-3.912
Mechanical 13:
  circle w0.1: c-3.1,8.15 r0.5
  lines w0.1: -3.632,-3.988 -3.632,9.05 3.327,9.05 3.327,-3.988 -3.632,-3.988
Mechanical 15:
  lines w0.1: -0.5,0 0.5,0 ; 0,-0.5 0,0.5 ; -5.029,-4.343 -5.029,9.55 4.877,9.55 4.877,-4.343 -5.029,-4.343
3D body: height 2.64, standoff 0, extent -3.632,-3.937 3.353,9.05

## SOP_24M_127 [mm] "SOP, 24-Leads, Body 15.6x8.1mm, Pitch 1.27mm, IPC Low Density"
height 2.5
pads (24):
  oval 2.7x0.7 smd: 1(-4.65,6.985) 2(-4.65,5.715) 3(-4.65,4.445) 4(-4.65,3.175) 5(-4.65,1.905) 6(-4.65,0.635) 7(-4.65,-0.635) 8(-4.65,-1.905) 9(-4.65,-3.175) 10(-4.65,-4.445) 11(-4.65,-5.715) 12(-4.65,-6.985) 13(4.65,-6.985) 14(4.65,-5.715) 15(4.65,-4.445) 16(4.65,-3.175) 17(4.65,-1.905) 18(4.65,-0.635) 19(4.65,0.635) 20(4.65,1.905) 21(4.65,3.175) 22(4.65,4.445) 23(4.65,5.715) 24(4.65,6.985)
Top Overlay:
  circle w0.25: c-4.65,7.885 r0.125
  circle w0.6: c-1.9,7.25 r0.3
  lines w0.2: -2.9,-8.25 -2.9,8.25 2.9,8.25 2.9,-8.25 -2.9,-8.25
Mechanical 13:
  circle w0.1: c-3.165,7.355 r0.5
  lines w0.1: -4.065,-8.255 -4.065,8.255 4.065,8.255 4.065,-8.255 -4.065,-8.255
Mechanical 15:
  lines w0.1: -0.5,0 0.5,0 ; 0,-0.5 0,0.5 ; -6.5,-8.8 -6.5,8.8 6.5,8.8 6.5,-8.8 -6.5,-8.8
3D body "SW3dPS-24 pin soic.STEP": height 2.7, standoff -0.11, extent -4.949,-7.853 5.051,7.747
3D body: height 2.79, standoff 0.25, extent -2.649,6.324 -1.785,7.111
3D body: height 2.79, standoff 2.54, extent -0.533,7.188 0.61,7.696

## SOP_28M_127 [mm] "SOP, 28-Leads, Body 18.1x8.6mm, Pitch 1.27mm, IPC Low Density"
height 3.05
pads (28):
  oval 2.7x0.7 smd: 1(-5.65,8.255) 2(-5.65,6.985) 3(-5.65,5.715) 4(-5.65,4.445) 5(-5.65,3.175) 6(-5.65,1.905) 7(-5.65,0.635) 8(-5.65,-0.635) 9(-5.65,-1.905) 10(-5.65,-3.175) 11(-5.65,-4.445) 12(-5.65,-5.715) 13(-5.65,-6.985) 14(-5.65,-8.255) 15(5.65,-8.255) 16(5.65,-6.985) 17(5.65,-5.715) 18(5.65,-4.445) 19(5.65,-3.175) 20(5.65,-1.905) 21(5.65,-0.635) 22(5.65,0.635) 23(5.65,1.905) 24(5.65,3.175) 25(5.65,4.445) 26(5.65,5.715) 27(5.65,6.985) 28(5.65,8.255)
Top Overlay:
  circle w0.25: c-5.65,9.155 r0.125
  circle w0.6: c-2.9,8.55 r0.3
  lines w0.2: -3.9,-9.55 -3.9,9.55 3.9,9.55 3.9,-9.55 -3.9,-9.55
Mechanical 13:
  circle w0.1: c-4.115,8.625 r0.5
  lines w0.1: -5.015,-9.525 -5.015,9.525 5.015,9.525 5.015,-9.525 -5.015,-9.525
Mechanical 15:
  lines w0.1: -0.5,0 0.5,0 ; 0,-0.5 0,0.5 ; -7.5,-10.05 -7.5,10.05 7.5,10.05 7.5,-10.05 -7.5,-10.05
3D body "SO28.STEP": height 2.64, standoff 0, extent -5.336,-9.04 5.334,9.04